# Altium footprint library YQPOWER.PcbLib: 215 footprints (part 3 of 14)
Each footprint in its own frame and in the unit in brackets; x right, y up, seen from the top. Pads: shape width x height; smd on the part's side, far side on the other; paste and mask are expansions set on the pad; w line width, h text height; cw(c..) or ccw(c..) is an arc to the next point about the centre after c.
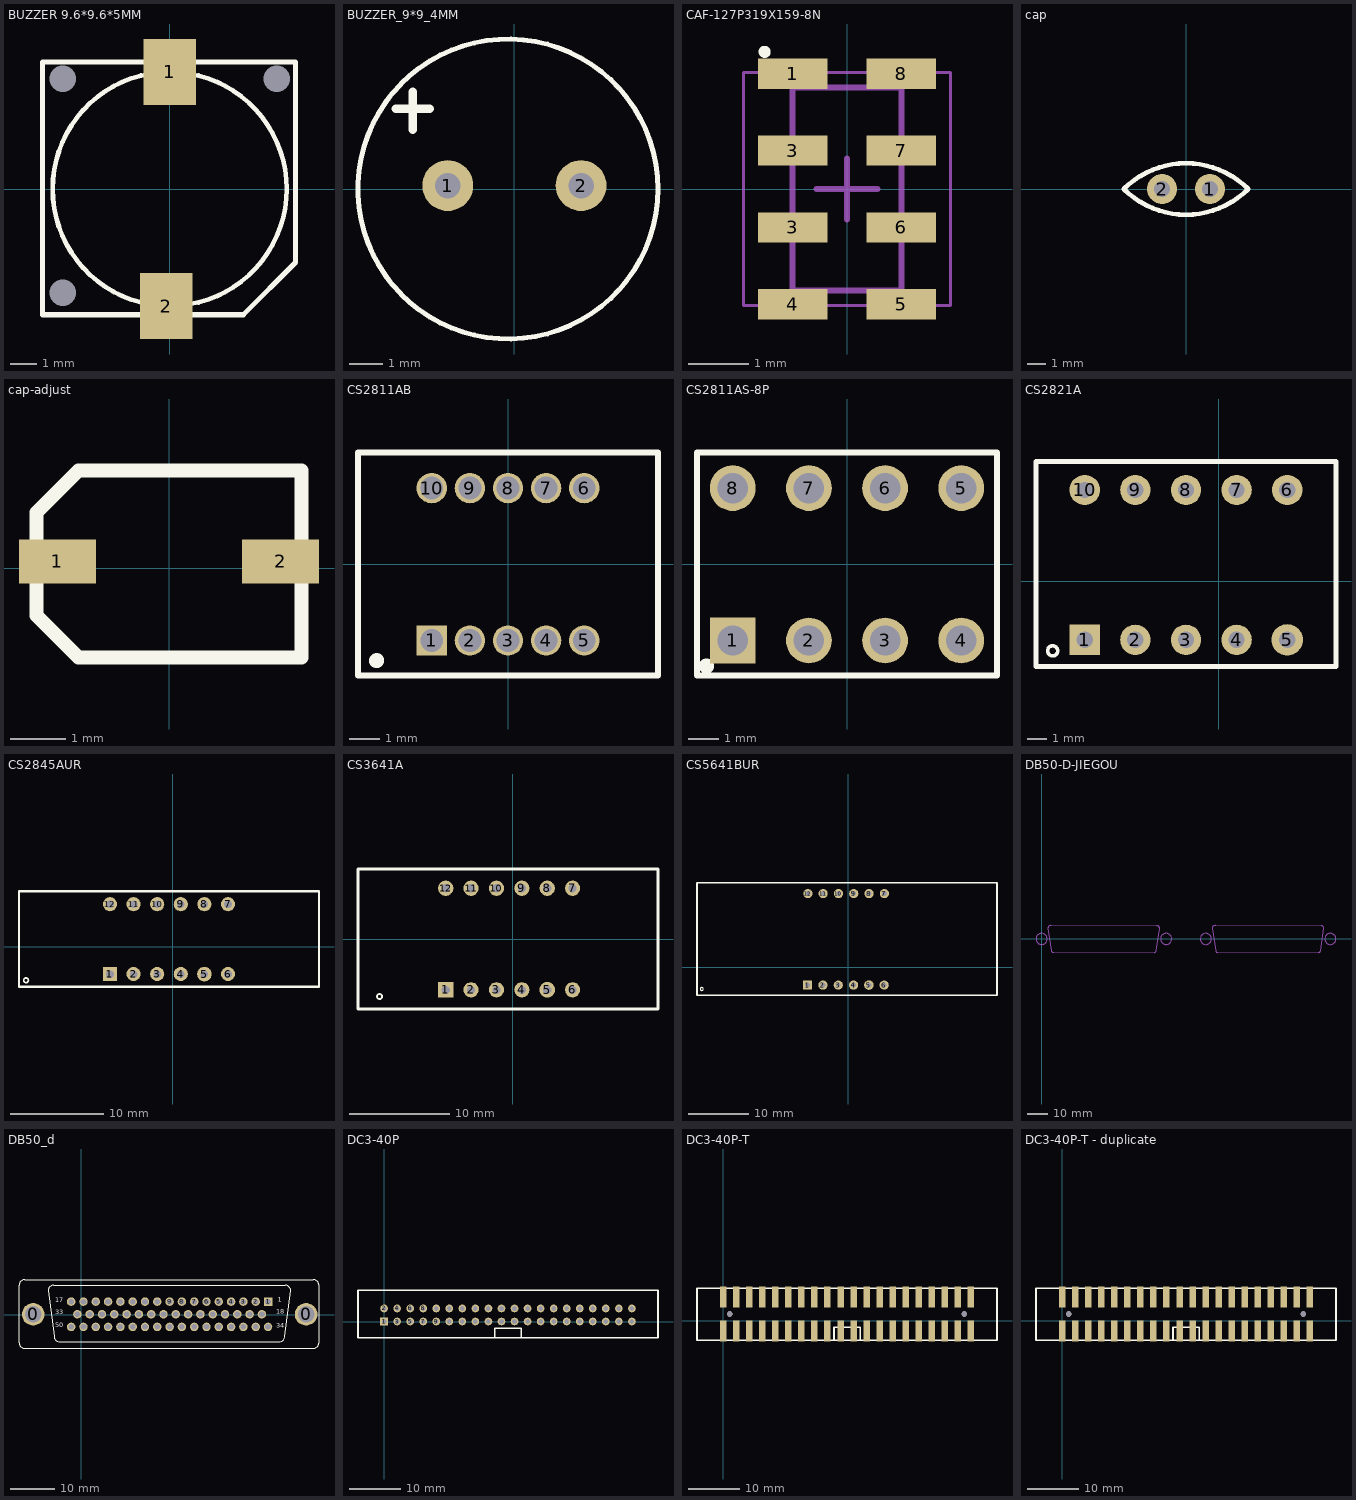
[diagram p2: the footprints below, top view; thin cyan lines are the x and y axes]

## BUZZER 9.6*9.6*5MM [mm]
pads (5):
  round 0 hole 1: 0(-4.064,-3.937) 0(-4.064,4.191) 0(4.064,4.191)
  rect 2x2.5 smd: 1(0,4.445) 2(-0.127,-4.445)
Top Overlay:
  circle w0.178: c0,0 r4.443
  lines w0.2: -4.826,-4.774 -4.826,4.826 4.774,4.826 4.774,-2.794 2.794,-4.774 -4.826,-4.774

## BUZZER_9*9_4MM [mil]
height 71
pads (2):
  round 60 hole 30: 1(-78.74,4.05) 2(78.74,4.05)
Top Overlay:
  circle w5.91: c-7.6,0 r177.17
  lines w10: -140,95 -100,95 ; -120,70 -120,115

## CAF-127P319X159-8N [mm] "Chip Array, Flat, 8-Leads, Pitch 1.27mm,  Body 3.20x1.60mm,  IPC Medium Density"
height 1
pads (8):
  rect 1.15x0.5 smd: 1(-0.9,1.905) 3(-0.9,-0.635) 3(-0.9,0.635) 4(-0.9,-1.905) 5(0.9,-1.905) 6(0.9,-0.635) 7(0.9,0.635) 8(0.9,1.905)
Top Overlay:
  circle w0.1: c-1.362,2.268 r0.05
Mechanical 13:
  lines w0.1: -0.9,-1.675 0.9,-1.675 0.9,1.675 -0.9,1.675 -0.9,-1.675
Mechanical 15:
  lines w0.05: -1.71,-1.925 1.71,-1.925 1.71,1.925 -1.71,1.925 -1.71,-1.925
  lines w0.1: -0.5,0 0.5,0 ; 0,-0.5 0,0.5
3D body: height 1, standoff 0, extent -0.9,-1.675 0.9,1.675

## cap [mil] "贴片电容"
height 400
pads (2):
  round 63 hole 33.5: 1(50,0) 2(-50,0)
Top Overlay:
  lines w10: -130,0 cw(c0,-130) 130,0 cw(c0,130) -130,0

## cap-adjust [mm] "可调电容"
pads (2):
  rect 1.4x0.8 smd: 1(-2.032,0.127) 2(2.032,0.127)
Top Overlay:
  lines w0.254: 2.413,-1.622 2.413,1.778 ; 2.413,-1.622 2.413,1.778 ; 2.413,-1.622 -1.651,-1.622 -2.413,-0.86 -2.413,1.016 -1.651,1.778 -1.524,1.778 2.413,1.778

## CS2811AB [mil] "LED, 7-Segment Display, 14.2 mm, RHD; 10 Leads; Row Space 15.24 mm; Pitch 2.54 mm"
height 324.8
pads (10):
  rect 40x40 hole 30: 1(-100,-100)
  round 40 hole 30: 2(-50,-100) 3(0,-100) 4(50,-100) 5(100,-100) 6(100,100) 7(50,100) 8(0,100) 9(-50,100) 10(-100,100)
Top Overlay:
  circle w9.84: c-172.44,-126.38 r4.92
  lines w7.87: -196.85,-145.67 196.85,-145.67 196.85,145.67 ; -196.85,-145.28 -196.85,146.06 ; -196.85,146.46 196.85,146.46
Mechanical 13:
  lines w3.94: -196.85,-145.67 196.85,-145.67 196.85,145.67 ; -196.85,-145.28 -196.85,146.06 ; -196.85,146.46 196.85,146.46

## CS2811AS-8P [mil] "LED, 7-Segment Display, 14.2 mm, RHD; 10 Leads; Row Space 15.24 mm; Pitch 2.54 mm"
height 324.8
pads (8):
  rect 60x60 hole 40: 1(-150,-100)
  round 60 hole 40: 2(-50,-100) 3(50,-100) 4(150,-100) 5(150,100) 6(50,100) 7(-50,100) 8(-150,100)
Top Overlay:
  circle w9.84: c-184.25,-133.46 r4.92
  lines w7.87: -196.85,-145.67 196.85,-145.67 196.85,145.67 ; -196.85,-145.28 -196.85,146.06 ; -196.85,146.46 196.85,146.46
Mechanical 13:
  lines w3.94: -196.85,-145.67 196.85,-145.67 196.85,145.67 ; -196.85,-145.28 -196.85,146.06 ; -196.85,146.46 196.85,146.46

## CS2821A [mil] "2位数码管"
pads (10):
  rect 60x60 hole 32: 1(-265,-116.06)
  round 60 hole 32: 2(-165,-116.06) 3(-65,-116.06) 4(35,-116.06) 6(135,180) 7(35,180) 8(-65,180) 9(-165,180) 10(-265,180)
  round 62 hole 32: 5(135,-116.06)
Top Overlay:
  circle w7: c-328.35,-137.8 r10
  lines w10: -361.22,-168.82 -361.22,236.18 ; -360.43,-168.82 230.91,-168.82 ; -360.04,236.3 231.3,236.3 ; 231.3,-168.82 231.3,236.18

## CS2845AUR [mil] "4位数码管"
pads (12):
  rect 60x60 hole 32: 1(-265,-116.06)
  round 60 hole 32: 2(-165,-116.06) 3(-65,-116.06) 4(35,-116.06) 6(235,-116.06) 7(235,180) 8(135,180) 9(35,180) 10(-65,180) 11(-165,180) 12(-265,180)
  round 62 hole 32: 5(135,-116.06)
Top Overlay:
  circle w7: c-620.47,-142.52 r10
  lines w10: -650.39,-170 620.47,-170 620.47,235 -650.39,235 -650.39,-170

## CS3641A [mil] "4位数码管"
pads (12):
  rect 60x60 hole 32: 1(-265,-200)
  round 60 hole 32: 2(-165,-200) 3(-65,-200) 4(35,-200) 6(235,-200) 7(235,200) 8(135,200) 9(35,200) 10(-65,200) 11(-165,200) 12(-265,200)
  round 62 hole 32: 5(135,-200)
Top Overlay:
  circle w7: c-525.59,-226.38 r10
  lines w10: -610.51,-275.59 -610.51,275.59 ; -610.24,-275.59 570.87,-275.59 ; -610.24,275.98 570.87,275.98 ; 571.38,-275.59 571.38,275.59

## CS5641BUR [mil] "4位共阳数码管"
pads (12):
  rect 60x60 hole 32: 1(-265,-116.06)
  round 60 hole 32: 2(-165,-116.06) 3(-65,-116.06) 4(35,-116.06) 6(235,-116.06) 7(236.22,481.89) 8(136.22,481.89) 9(36.22,481.89) 10(-63.78,481.89) 11(-163.78,481.89) 12(-263.78,481.89)
  round 62 hole 32: 5(135,-116.06)
Top Overlay:
  circle w7: c-956.69,-141.73 r10
  lines w10: -988.19,-181.1 -988.19,551.18 972.44,551.18 972.44,-181.1 -988.19,-181.1

## DB50-D-JIEGOU [mm]
Mechanical 1:
  lines w0.1: -0.172,-2.745 cw(c0,0) -0.137,-2.747 ; 4.816,-5.689 ccw(c5.809,-5.689) 5.809,-6.682 ; 4.844,-5.925 3.128,5.258 cw(c4.52,5.258) 4.528,6.65 56.893,6.527 cw(c56.893,5.258) 58.163,5.258 56.532,-5.696 ; 5.809,-6.671 55.539,-6.684 ccw(c55.54,-5.702) 56.521,-5.702 ; 61.22,-2.745 cw(c61.392,0) 61.254,-2.747 ; 80.829,-2.745 cw(c81.001,0) 80.863,-2.747 ; 85.816,-5.689 ccw(c86.809,-5.689) 86.809,-6.682 ; 85.845,-5.925 84.128,5.258 cw(c85.521,5.258) 85.528,6.65 137.893,6.527 cw(c137.893,5.258) 139.163,5.258 137.532,-5.696 ; 86.809,-6.671 136.54,-6.684 ccw(c136.54,-5.702) 137.522,-5.702 ; 142.221,-2.745 cw(c142.392,0) 142.255,-2.747

## DB50_d [mil]
height 53.15
pads (52):
  round 200 hole 145: 0(-426,6) 0(1991,6)
  rect 75x75 hole 50: 1(1654,118)
  round 75 hole 50: 2(1545,118) 3(1436,118) 4(1327,118) 5(1218,118) 6(1109,118) 7(1000,118) 8(891,118) 9(782,118) 10(673,118) 11(564,118) 12(455,118) 13(346,118) 14(237,118) 15(128,118) 16(19,118) 17(-90,118) 18(1600,6) 19(1491,6) 20(1382,6) 21(1273,6) 22(1164,6) 23(1055,6) 24(946,6) 25(837,6) 26(728,6) 27(619,6) 28(510,6) 29(401,6) 30(292,6) 31(183,6) 32(74,6) 33(-35,6) 34(1654,-106) 35(1545,-106) 36(1436,-106) 37(1327,-106) 38(1218,-106) 39(1109,-106) 40(1000,-106) 41(891,-106) 42(782,-106) 43(673,-106) 44(564,-106) 45(455,-106) 46(346,-106) 47(237,-106) 48(128,-106) 49(19,-106) 50(-90,-106)
Top Overlay:
  lines w10: -492,312 2055.48,312 cw(c2055.48,262) 2105.48,262 2105.48,-245 cw(c2055.48,-245) 2055.48,-295 -502,-295 cw(c-502,-245) -552,-245 -552,262 cw(c-502,262) -502,312 -465,312 ; -85,-237 1620,-237 1755,-237 ccw(c1755,-190) 1802,-190 1856,213 ccw(c1806,213) 1806,263 1663,263 ; -59,-237 -194,-237 cw(c-194,-190) -241,-190 -295,213 cw(c-245,213) -245,263 -102,263 1676,263
  text "18" at 1727,-8 h70
  text "34" at 1728,-129 h70
  text "50" at -230,-125 h70
  text "33" at -230,-11 h70
  text "1" at 1740,101 h70
  text "17" at -231,97 h70

## DC3-40P [mm] "Connector; Header; 20x2 Position"
pads (40):
  rect 1.5x1.5 hole 0.9: 1(0,0)
  round 1.5 hole 0.9: 2(0,2.54) 3(2.54,0) 4(2.54,2.54) 5(5.08,0) 6(5.08,2.54) 7(7.62,0) 8(7.62,2.54) 9(10.16,0) 10(10.16,2.54) 11(12.7,0) 12(12.7,2.54) 13(15.24,0) 14(15.24,2.54) 15(17.78,0) 16(17.78,2.54) 17(20.32,0) 18(20.32,2.54) 19(22.86,0) 20(22.86,2.54) 21(25.4,0) 22(25.4,2.54) 23(27.94,0) 24(27.94,2.54) 25(30.48,0) 26(30.48,2.54) 27(33.02,0) 28(33.02,2.54) 29(35.56,0) 30(35.56,2.54) 31(38.1,0) 32(38.1,2.54) 33(40.64,0) 34(40.64,2.54) 35(43.18,0) 36(43.18,2.54) 37(45.72,0) 38(45.72,2.54) 39(48.26,0) 40(48.26,2.54)
Top Overlay:
  lines w0.3: 21.59,-3.175 21.59,-1.27 26.67,-1.27 26.67,-3.175 ; -5.08,-3.175 -5.08,6.096 53.34,6.096 53.34,-3.175 -5.08,-3.175

## DC3-40P-T [mil] "Connector; Header; 20x2 Position"
pads (42):
  round 39.37 hole 45.28: 0(50,51.57) 0(1850,51.57)
  rect 50x160 smd: 1(0,-77.87) 2(0,181.02) 3(100,-77.87) 4(100,181.02) 5(200,-77.87) 6(200,181.02) 7(300,-77.87) 8(300,181.02) 9(400,-77.87) 10(400,181.02) 11(500,-77.87) 12(500,181.02) 13(600,-77.87) 14(600,181.02) 15(700,-77.87) 16(700,181.02) 17(800,-77.87) 18(800,181.02) 19(900,-77.87) 20(900,181.02) 21(1000,-77.87) 22(1000,181.02) 23(1100,-77.87) 24(1100,181.02) 25(1200,-77.87) 26(1200,181.02) 27(1300,-77.87) 28(1300,181.02) 29(1400,-77.87) 30(1400,181.02) 31(1500,-77.87) 32(1500,181.02) 33(1600,-77.87) 34(1600,181.02) 35(1700,-77.87) 36(1700,181.02) 37(1800,-77.87) 38(1800,181.02) 39(1900,-77.87) 40(1900,181.02)
Top Overlay:
  lines w11.81: 850,-147.64 850,-50 1050,-50 1050,-147.64 ; -201.57,-148.82 2101.18,-148.82 2101.18,249.61 -201.57,249.61 -201.57,-148.82

## DC3-40P-T - duplicate [mil] "Connector; Header; 20x2 Position"
pads (42):
  round 39.37 hole 45.28: 0(50,51.57) 0(1850,51.57)
  rect 50x160 smd: 1(0,-77.87) 2(0,181.02) 3(100,-77.87) 4(100,181.02) 5(200,-77.87) 6(200,181.02) 7(300,-77.87) 8(300,181.02) 9(400,-77.87) 10(400,181.02) 11(500,-77.87) 12(500,181.02) 13(600,-77.87) 14(600,181.02) 15(700,-77.87) 16(700,181.02) 17(800,-77.87) 18(800,181.02) 19(900,-77.87) 20(900,181.02) 21(1000,-77.87) 22(1000,181.02) 23(1100,-77.87) 24(1100,181.02) 25(1200,-77.87) 26(1200,181.02) 27(1300,-77.87) 28(1300,181.02) 29(1400,-77.87) 30(1400,181.02) 31(1500,-77.87) 32(1500,181.02) 33(1600,-77.87) 34(1600,181.02) 35(1700,-77.87) 36(1700,181.02) 37(1800,-77.87) 38(1800,181.02) 39(1900,-77.87) 40(1900,181.02)
Top Overlay:
  lines w11.81: 850,-147.64 850,-50 1050,-50 1050,-147.64 ; -201.57,-148.82 2101.18,-148.82 2101.18,249.61 -201.57,249.61 -201.57,-148.82